# Altium footprint library Package_DFN_QFN.PcbLib: 557 footprints (part 18 of 35)
Each footprint in its own frame and in the unit in brackets; x right, y up, seen from the top. Pads: shape width x height; smd on the part's side, far side on the other; paste and mask are expansions set on the pad; w line width, h text height; cw(c..) or ccw(c..) is an arc to the next point about the centre after c.
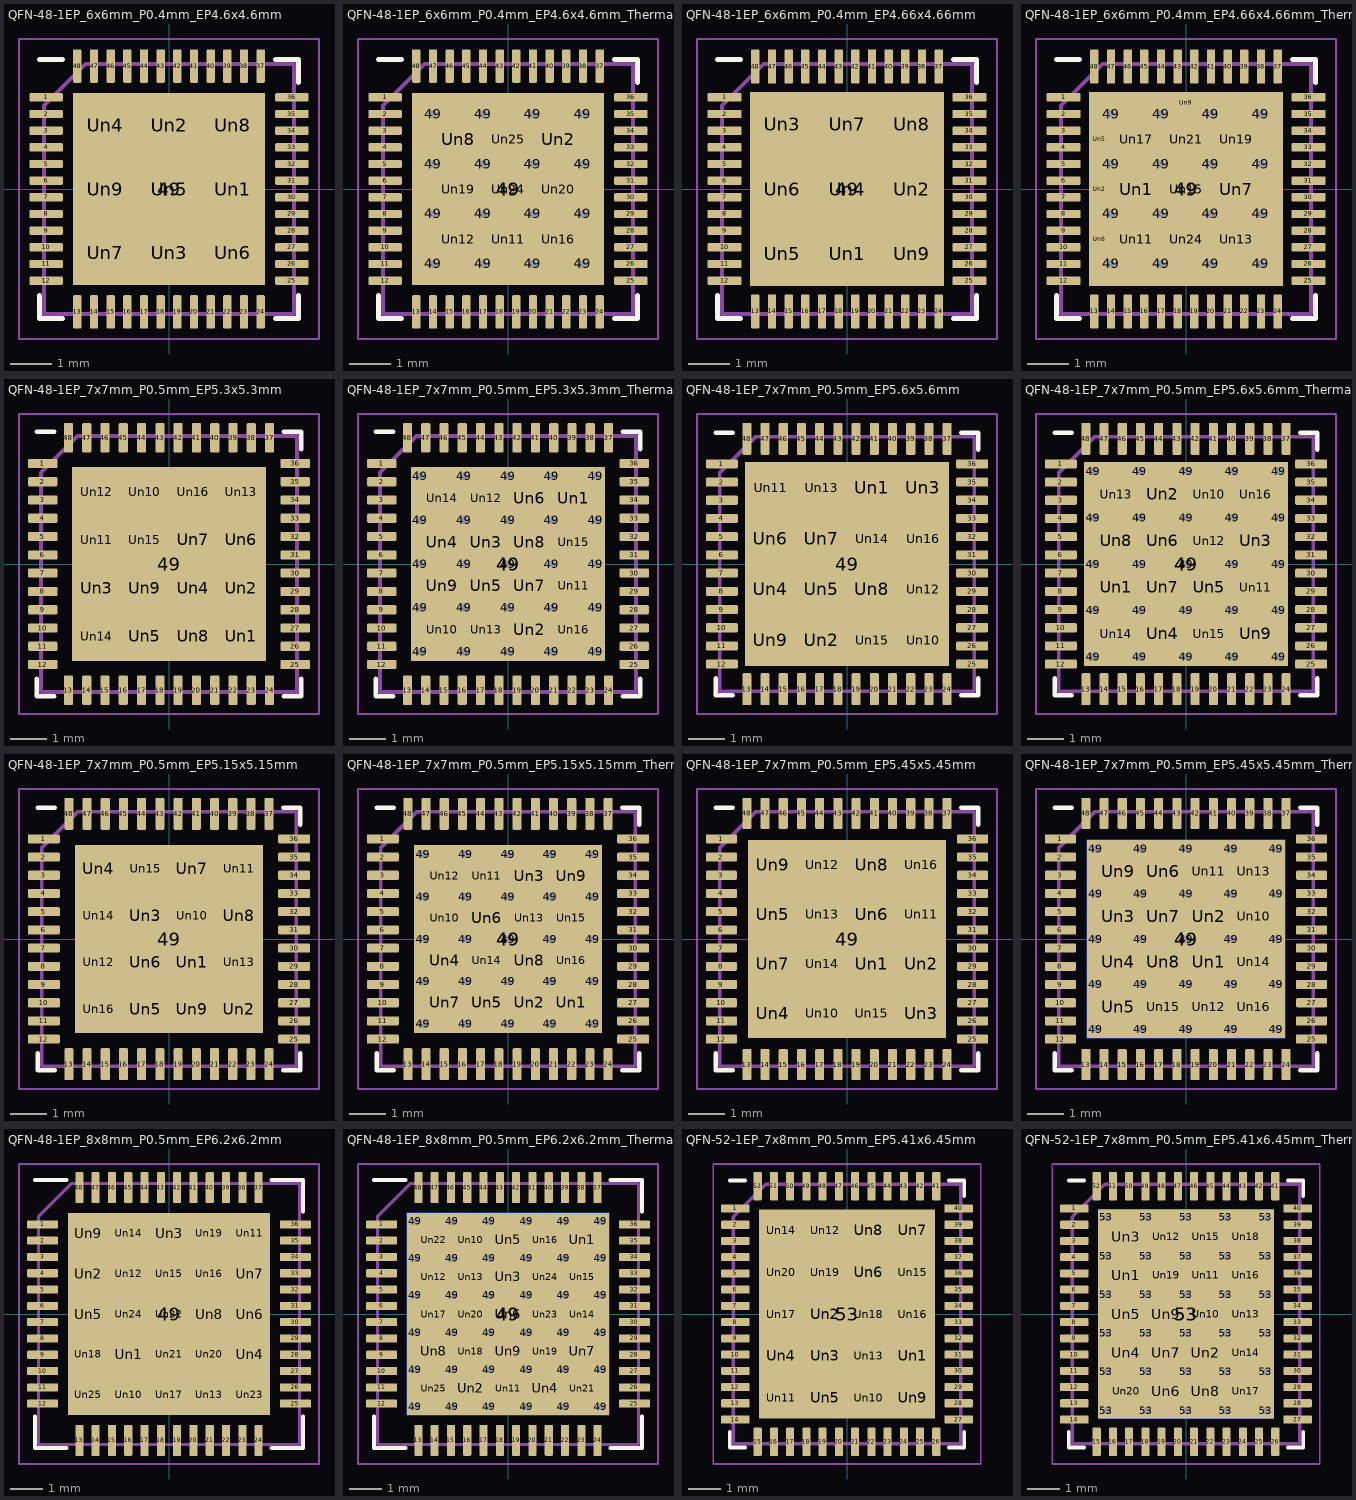
[diagram p17: the footprints below, top view; thin cyan lines are the x and y axes]

## QFN-48-1EP_6x6mm_P0.4mm_EP4.6x4.6mm [mm]
pads (58):
  rrect25% 0.8x0.2 smd: 1(-2.95,2.2) 2(-2.95,1.8) 3(-2.95,1.4) 4(-2.95,1) 5(-2.95,0.6) 6(-2.95,0.2) 7(-2.95,-0.2) 8(-2.95,-0.6) 9(-2.95,-1) 10(-2.95,-1.4) 11(-2.95,-1.8) 12(-2.95,-2.2) 25(2.95,-2.2) 26(2.95,-1.8) 27(2.95,-1.4) 28(2.95,-1) 29(2.95,-0.6) 30(2.95,-0.2) 31(2.95,0.2) 32(2.95,0.6) 33(2.95,1) 34(2.95,1.4) 35(2.95,1.8) 36(2.95,2.2)
  rrect25% 0.2x0.8 smd: 13(-2.2,-2.95) 14(-1.8,-2.95) 15(-1.4,-2.95) 16(-1,-2.95) 17(-0.6,-2.95) 18(-0.2,-2.95) 19(0.2,-2.95) 20(0.6,-2.95) 21(1,-2.95) 22(1.4,-2.95) 23(1.8,-2.95) 24(2.2,-2.95) 37(2.2,2.95) 38(1.8,2.95) 39(1.4,2.95) 40(1,2.95) 41(0.6,2.95) 42(0.2,2.95) 43(-0.2,2.95) 44(-0.6,2.95) 45(-1,2.95) 46(-1.4,2.95) 47(-1.8,2.95) 48(-2.2,2.95)
  rect 4.6x4.6 smd: 49(0,0)
  rrect20% 1.24x1.24 on Top Paste: Un1(1.53,0) Un2(0,1.53) Un3(0,-1.53) Un4(-1.53,1.53) Un5(0,0) Un6(1.53,-1.53) Un7(-1.53,-1.53) Un8(1.53,1.53) Un9(-1.53,0)
F.SilkS:
  lines w0.12: -3.11,-2.56 -3.11,-3.11 -2.56,-3.11 ; -3.11,3.11 -2.56,3.11 ; 2.56,-3.11 3.11,-3.11 3.11,-2.56 ; 2.56,3.11 3.11,3.11 3.11,2.56
F.CrtYd:
  lines w0.05: -3.6,-3.6 3.6,-3.6 3.6,3.6 -3.6,3.6 -3.6,-3.6
F.Fab:
  lines w0.1: -3,-3 3,-3 3,3 -2,3 -3,2 -3,-3
  text "'.Designator'" at -4.047,-0.84 h1

## QFN-48-1EP_6x6mm_P0.4mm_EP4.6x4.6mm_ThermalVias [mm]
pads (91):
  rrect25% 0.8x0.2 smd: 1(-2.95,2.2) 2(-2.95,1.8) 3(-2.95,1.4) 4(-2.95,1) 5(-2.95,0.6) 6(-2.95,0.2) 7(-2.95,-0.2) 8(-2.95,-0.6) 9(-2.95,-1) 10(-2.95,-1.4) 11(-2.95,-1.8) 12(-2.95,-2.2) 25(2.95,-2.2) 26(2.95,-1.8) 27(2.95,-1.4) 28(2.95,-1) 29(2.95,-0.6) 30(2.95,-0.2) 31(2.95,0.2) 32(2.95,0.6) 33(2.95,1) 34(2.95,1.4) 35(2.95,1.8) 36(2.95,2.2)
  rrect25% 0.2x0.8 smd: 13(-2.2,-2.95) 14(-1.8,-2.95) 15(-1.4,-2.95) 16(-1,-2.95) 17(-0.6,-2.95) 18(-0.2,-2.95) 19(0.2,-2.95) 20(0.6,-2.95) 21(1,-2.95) 22(1.4,-2.95) 23(1.8,-2.95) 24(2.2,-2.95) 37(2.2,2.95) 38(1.8,2.95) 39(1.4,2.95) 40(1,2.95) 41(0.6,2.95) 42(0.2,2.95) 43(-0.2,2.95) 44(-0.6,2.95) 45(-1,2.95) 46(-1.4,2.95) 47(-1.8,2.95) 48(-2.2,2.95)
  round 0.5 hole 0.2: 49(-1.8,-1.8) 49(-1.8,-0.6) 49(-1.8,0.6) 49(-1.8,1.8) 49(-0.6,-1.8) 49(-0.6,-0.6) 49(-0.6,0.6) 49(-0.6,1.8) 49(0.6,-1.8) 49(0.6,-0.6) 49(0.6,0.6) 49(0.6,1.8) 49(1.8,-1.8) 49(1.8,-0.6) 49(1.8,0.6) 49(1.8,1.8)
  rect 4.1x4.1 smd far side: 49(0,0)
  rect 4.6x4.6 smd: 49(0,0)
  round 0.32 on Top Paste: Un1(0,2.05) Un3(-1.2,-2.05) Un4(2.05,-1.2) Un5(2.05,1.2) Un7(1.2,-2.05) Un10(1.2,2.05) Un14(2.05,0) Un15(-2.05,0) Un17(0,-2.05) Un18(-2.05,1.2) Un21(-1.2,2.05) Un23(-2.05,-1.2)
  rrect25% 0.967x0.967 on Top Paste: Un2(1.2,1.2) Un8(-1.2,1.2) Un11(0,-1.2) Un12(-1.2,-1.2) Un16(1.2,-1.2) Un19(-1.2,0) Un20(1.2,0) Un24(0,0) Un25(0,1.2)
  round 0.272 on Top Paste: Un6(-2.05,2.05) Un9(2.05,-2.05) Un13(-2.05,-2.05) Un22(2.05,2.05)
F.SilkS:
  lines w0.12: -3.11,-2.56 -3.11,-3.11 -2.56,-3.11 ; -3.11,3.11 -2.56,3.11 ; 2.56,-3.11 3.11,-3.11 3.11,-2.56 ; 2.56,3.11 3.11,3.11 3.11,2.56
F.Paste:
  region: 0.4,2.001 0.331,1.932 -0.331,1.932 -0.4,2.001 -0.4,2.168 0.4,2.168
  region: -0.8,-2.001 -0.8,-2.168 -1.6,-2.168 -1.6,-2.001 -1.531,-1.932 -0.869,-1.932
  region: 2.168,-1.6 2.001,-1.6 1.932,-1.531 1.932,-0.869 2.001,-0.8 2.168,-0.8
  region: 2.168,0.8 2.001,0.8 1.932,0.869 1.932,1.531 2.001,1.6 2.168,1.6
  region: -1.949,2.076 -2.076,1.949 -2.151,1.949 -2.151,2.151 -1.949,2.151
  region: 1.6,-2.001 1.6,-2.168 0.8,-2.168 0.8,-2.001 0.869,-1.932 1.531,-1.932
  region: 2.151,-2.151 1.949,-2.151 1.949,-2.076 2.076,-1.949 2.151,-1.949
  region: 1.6,2.001 1.531,1.932 0.869,1.932 0.8,2.001 0.8,2.168 1.6,2.168
  region: -1.949,-2.076 -1.949,-2.151 -2.151,-2.151 -2.151,-1.949 -2.076,-1.949
  region: 2.168,-0.4 2.001,-0.4 1.932,-0.331 1.932,0.331 2.001,0.4 2.168,0.4
  region: -1.932,0.331 -1.932,-0.331 -2.001,-0.4 -2.168,-0.4 -2.168,0.4 -2.001,0.4
  region: 0.4,-2.001 0.4,-2.168 -0.4,-2.168 -0.4,-2.001 -0.331,-1.932 0.331,-1.932
  region: -1.932,1.531 -1.932,0.869 -2.001,0.8 -2.168,0.8 -2.168,1.6 -2.001,1.6
  region: -0.8,2.001 -0.869,1.932 -1.531,1.932 -1.6,2.001 -1.6,2.168 -0.8,2.168
  region: 2.151,1.949 2.076,1.949 1.949,2.076 1.949,2.151 2.151,2.151
  region: -1.932,-0.869 -1.932,-1.531 -2.001,-1.6 -2.168,-1.6 -2.168,-0.8 -2.001,-0.8
F.CrtYd:
  lines w0.05: -3.6,-3.6 -3.6,3.6 3.6,3.6 3.6,-3.6 -3.6,-3.6
F.Fab:
  lines w0.1: -3,-3 -3,2 -2,3 3,3 3,-3 -3,-3
  text "'.Designator'" at -4.047,-0.84 h1

## QFN-48-1EP_6x6mm_P0.4mm_EP4.66x4.66mm [mm]
pads (58):
  rrect25% 0.82x0.2 smd: 1(-2.94,2.2) 2(-2.94,1.8) 3(-2.94,1.4) 4(-2.94,1) 5(-2.94,0.6) 6(-2.94,0.2) 7(-2.94,-0.2) 8(-2.94,-0.6) 9(-2.94,-1) 10(-2.94,-1.4) 11(-2.94,-1.8) 12(-2.94,-2.2) 25(2.94,-2.2) 26(2.94,-1.8) 27(2.94,-1.4) 28(2.94,-1) 29(2.94,-0.6) 30(2.94,-0.2) 31(2.94,0.2) 32(2.94,0.6) 33(2.94,1) 34(2.94,1.4) 35(2.94,1.8) 36(2.94,2.2)
  rrect25% 0.2x0.82 smd: 13(-2.2,-2.94) 14(-1.8,-2.94) 15(-1.4,-2.94) 16(-1,-2.94) 17(-0.6,-2.94) 18(-0.2,-2.94) 19(0.2,-2.94) 20(0.6,-2.94) 21(1,-2.94) 22(1.4,-2.94) 23(1.8,-2.94) 24(2.2,-2.94) 37(2.2,2.94) 38(1.8,2.94) 39(1.4,2.94) 40(1,2.94) 41(0.6,2.94) 42(0.2,2.94) 43(-0.2,2.94) 44(-0.6,2.94) 45(-1,2.94) 46(-1.4,2.94) 47(-1.8,2.94) 48(-2.2,2.94)
  rect 4.66x4.66 smd: 49(0,0)
  rrect20% 1.25x1.25 on Top Paste: Un1(0,-1.55) Un2(1.55,0) Un3(-1.55,1.55) Un4(0,0) Un5(-1.55,-1.55) Un6(-1.55,0) Un7(0,1.55) Un8(1.55,1.55) Un9(1.55,-1.55)
F.SilkS:
  lines w0.12: -3.11,-2.56 -3.11,-3.11 -2.56,-3.11 ; -3.11,3.11 -2.56,3.11 ; 2.56,-3.11 3.11,-3.11 3.11,-2.56 ; 2.56,3.11 3.11,3.11 3.11,2.56
F.CrtYd:
  lines w0.05: -3.6,-3.6 -3.6,3.6 3.6,3.6 3.6,-3.6 -3.6,-3.6
F.Fab:
  lines w0.1: -3,-3 -3,2 -2,3 3,3 3,-3 -3,-3
  text "'.Designator'" at -4.047,-0.84 h1

## QFN-48-1EP_6x6mm_P0.4mm_EP4.66x4.66mm_ThermalVias [mm]
pads (91):
  rrect25% 0.82x0.2 smd: 1(-2.94,2.2) 2(-2.94,1.8) 3(-2.94,1.4) 4(-2.94,1) 5(-2.94,0.6) 6(-2.94,0.2) 7(-2.94,-0.2) 8(-2.94,-0.6) 9(-2.94,-1) 10(-2.94,-1.4) 11(-2.94,-1.8) 12(-2.94,-2.2) 25(2.94,-2.2) 26(2.94,-1.8) 27(2.94,-1.4) 28(2.94,-1) 29(2.94,-0.6) 30(2.94,-0.2) 31(2.94,0.2) 32(2.94,0.6) 33(2.94,1) 34(2.94,1.4) 35(2.94,1.8) 36(2.94,2.2)
  rrect25% 0.2x0.82 smd: 13(-2.2,-2.94) 14(-1.8,-2.94) 15(-1.4,-2.94) 16(-1,-2.94) 17(-0.6,-2.94) 18(-0.2,-2.94) 19(0.2,-2.94) 20(0.6,-2.94) 21(1,-2.94) 22(1.4,-2.94) 23(1.8,-2.94) 24(2.2,-2.94) 37(2.2,2.94) 38(1.8,2.94) 39(1.4,2.94) 40(1,2.94) 41(0.6,2.94) 42(0.2,2.94) 43(-0.2,2.94) 44(-0.6,2.94) 45(-1,2.94) 46(-1.4,2.94) 47(-1.8,2.94) 48(-2.2,2.94)
  round 0.5 hole 0.2: 49(-1.8,-1.8) 49(-1.8,-0.6) 49(-1.8,0.6) 49(-1.8,1.8) 49(-0.6,-1.8) 49(-0.6,-0.6) 49(-0.6,0.6) 49(-0.6,1.8) 49(0.6,-1.8) 49(0.6,-0.6) 49(0.6,0.6) 49(0.6,1.8) 49(1.8,-1.8) 49(1.8,-0.6) 49(1.8,0.6) 49(1.8,1.8)
  rect 4.1x4.1 smd far side: 49(0,0)
  rect 4.66x4.66 smd: 49(0,0)
  rrect25% 0.967x0.967 on Top Paste: Un1(-1.2,0) Un7(1.2,0) Un11(-1.2,-1.2) Un13(1.2,-1.2) Un15(0,0) Un17(-1.2,1.2) Un19(1.2,1.2) Un21(0,1.2) Un24(0,-1.2)
  round 0.346 on Top Paste: Un2(-2.065,0) Un5(-2.065,1.2) Un6(-2.065,-1.2) Un9(0,2.065) Un10(0,-2.065) Un12(-1.2,-2.065) Un16(1.2,2.065) Un18(2.065,0) Un20(2.065,1.2) Un22(2.065,-1.2) Un23(1.2,-2.065) Un25(-1.2,2.065)
  round 0.3 on Top Paste: Un3(2.065,-2.065) Un4(2.065,2.065) Un8(-2.065,-2.065) Un14(-2.065,2.065)
F.SilkS:
  lines w0.12: -3.11,-2.56 -3.11,-3.11 -2.56,-3.11 ; -3.11,3.11 -2.56,3.11 ; 2.56,-3.11 3.11,-3.11 3.11,-2.56 ; 2.56,3.11 3.11,3.11 3.11,2.56
F.Paste:
  region: -1.933,0.335 -1.933,-0.335 -2,-0.402 -2.197,-0.402 -2.197,0.402 -2,0.402
  region: 2.172,-2.172 1.958,-2.172 1.958,-2.076 2.076,-1.958 2.172,-1.958
  region: 2.172,1.958 2.076,1.958 1.958,2.076 1.958,2.172 2.172,2.172
  region: -1.933,1.535 -1.933,0.865 -2,0.798 -2.197,0.798 -2.197,1.602 -2,1.602
  region: -1.933,-0.865 -1.933,-1.535 -2,-1.602 -2.197,-1.602 -2.197,-0.798 -2,-0.798
  region: -1.958,-2.076 -1.958,-2.172 -2.172,-2.172 -2.172,-1.958 -2.076,-1.958
  region: 0.402,2 0.335,1.933 -0.335,1.933 -0.402,2 -0.402,2.197 0.402,2.197
  region: 0.402,-2 0.402,-2.197 -0.402,-2.197 -0.402,-2 -0.335,-1.933 0.335,-1.933
  region: -0.798,-2 -0.798,-2.197 -1.602,-2.197 -1.602,-2 -1.535,-1.933 -0.865,-1.933
  region: -1.958,2.076 -2.076,1.958 -2.172,1.958 -2.172,2.172 -1.958,2.172
  region: 1.602,2 1.535,1.933 0.865,1.933 0.798,2 0.798,2.197 1.602,2.197
  region: 2.197,-0.402 2,-0.402 1.933,-0.335 1.933,0.335 2,0.402 2.197,0.402
  region: 2.197,0.798 2,0.798 1.933,0.865 1.933,1.535 2,1.602 2.197,1.602
  region: 2.197,-1.602 2,-1.602 1.933,-1.535 1.933,-0.865 2,-0.798 2.197,-0.798
  region: 1.602,-2 1.602,-2.197 0.798,-2.197 0.798,-2 0.865,-1.933 1.535,-1.933
  region: -0.798,2 -0.865,1.933 -1.535,1.933 -1.602,2 -1.602,2.197 -0.798,2.197
F.CrtYd:
  lines w0.05: -3.6,-3.6 3.6,-3.6 3.6,3.6 -3.6,3.6 -3.6,-3.6
F.Fab:
  lines w0.1: -3,-3 -3,2 -2,3 3,3 3,-3 -3,-3
  text "'.Designator'" at -4.047,-0.84 h1

## QFN-48-1EP_7x7mm_P0.5mm_EP5.3x5.3mm [mm]
pads (65):
  rrect25% 0.8x0.25 smd: 1(-3.45,2.75) 2(-3.45,2.25) 3(-3.45,1.75) 4(-3.45,1.25) 5(-3.45,0.75) 6(-3.45,0.25) 7(-3.45,-0.25) 8(-3.45,-0.75) 9(-3.45,-1.25) 10(-3.45,-1.75) 11(-3.45,-2.25) 12(-3.45,-2.75) 25(3.45,-2.75) 26(3.45,-2.25) 27(3.45,-1.75) 28(3.45,-1.25) 29(3.45,-0.75) 30(3.45,-0.25) 31(3.45,0.25) 32(3.45,0.75) 33(3.45,1.25) 34(3.45,1.75) 35(3.45,2.25) 36(3.45,2.75)
  rrect25% 0.25x0.8 smd: 13(-2.75,-3.45) 14(-2.25,-3.45) 15(-1.75,-3.45) 16(-1.25,-3.45) 17(-0.75,-3.45) 18(-0.25,-3.45) 19(0.25,-3.45) 20(0.75,-3.45) 21(1.25,-3.45) 22(1.75,-3.45) 23(2.25,-3.45) 24(2.75,-3.45) 37(2.75,3.45) 38(2.25,3.45) 39(1.75,3.45) 40(1.25,3.45) 41(0.75,3.45) 42(0.25,3.45) 43(-0.25,3.45) 44(-0.75,3.45) 45(-1.25,3.45) 46(-1.75,3.45) 47(-2.25,3.45) 48(-2.75,3.45)
  rect 5.3x5.3 smd: 49(0,0)
  rrect23% 1.07x1.07 on Top Paste: Un1(1.98,-1.98) Un2(1.98,-0.66) Un3(-1.98,-0.66) Un4(0.66,-0.66) Un5(-0.66,-1.98) Un6(1.98,0.66) Un7(0.66,0.66) Un8(0.66,-1.98) Un9(-0.66,-0.66) Un10(-0.66,1.98) Un11(-1.98,0.66) Un12(-1.98,1.98) Un13(1.98,1.98) Un14(-1.98,-1.98) Un15(-0.66,0.66) Un16(0.66,1.98)
F.SilkS:
  lines w0.12: -3.61,-3.135 -3.61,-3.61 -3.135,-3.61 ; -3.61,3.61 -3.135,3.61 ; 3.135,-3.61 3.61,-3.61 3.61,-3.135 ; 3.135,3.61 3.61,3.61 3.61,3.135
F.CrtYd:
  lines w0.05: -4.1,-4.1 4.1,-4.1 4.1,4.1 -4.1,4.1 -4.1,-4.1
F.Fab:
  lines w0.1: -3.5,-3.5 3.5,-3.5 3.5,3.5 -2.5,3.5 -3.5,2.5 -3.5,-3.5
  text "'.Designator'" at -4.047,-0.84 h1

## QFN-48-1EP_7x7mm_P0.5mm_EP5.3x5.3mm_ThermalVias [mm]
pads (91):
  rrect25% 0.8x0.25 smd: 1(-3.45,2.75) 2(-3.45,2.25) 3(-3.45,1.75) 4(-3.45,1.25) 5(-3.45,0.75) 6(-3.45,0.25) 7(-3.45,-0.25) 8(-3.45,-0.75) 9(-3.45,-1.25) 10(-3.45,-1.75) 11(-3.45,-2.25) 12(-3.45,-2.75) 25(3.45,-2.75) 26(3.45,-2.25) 27(3.45,-1.75) 28(3.45,-1.25) 29(3.45,-0.75) 30(3.45,-0.25) 31(3.45,0.25) 32(3.45,0.75) 33(3.45,1.25) 34(3.45,1.75) 35(3.45,2.25) 36(3.45,2.75)
  rrect25% 0.25x0.8 smd: 13(-2.75,-3.45) 14(-2.25,-3.45) 15(-1.75,-3.45) 16(-1.25,-3.45) 17(-0.75,-3.45) 18(-0.25,-3.45) 19(0.25,-3.45) 20(0.75,-3.45) 21(1.25,-3.45) 22(1.75,-3.45) 23(2.25,-3.45) 24(2.75,-3.45) 37(2.75,3.45) 38(2.25,3.45) 39(1.75,3.45) 40(1.25,3.45) 41(0.75,3.45) 42(0.25,3.45) 43(-0.25,3.45) 44(-0.75,3.45) 45(-1.25,3.45) 46(-1.75,3.45) 47(-2.25,3.45) 48(-2.75,3.45)
  round 0.5 hole 0.2: 49(-2.4,-2.4) 49(-2.4,-1.2) 49(-2.4,0) 49(-2.4,1.2) 49(-2.4,2.4) 49(-1.2,-2.4) 49(-1.2,-1.2) 49(-1.2,0) 49(-1.2,1.2) 49(-1.2,2.4) 49(0,-2.4) 49(0,-1.2) 49(0,0) 49(0,1.2) 49(0,2.4) 49(1.2,-2.4) 49(1.2,-1.2) 49(1.2,0) 49(1.2,1.2) 49(1.2,2.4) 49(2.4,-2.4) 49(2.4,-1.2) 49(2.4,0) 49(2.4,1.2) 49(2.4,2.4)
  rect 5.3x5.3 smd: 49(0,0)
  rect 5.3x5.3 smd far side: 49(0,0)
  rrect24% 1.026x1.026 on Top Paste: Un1(1.8,1.8) Un2(0.6,-1.8) Un3(-0.6,0.6) Un4(-1.8,0.6) Un5(-0.6,-0.6) Un6(0.6,1.8) Un7(0.6,-0.6) Un8(0.6,0.6) Un9(-1.8,-0.6) Un10(-1.8,-1.8) Un11(1.8,-0.6) Un12(-0.6,1.8) Un13(-0.6,-1.8) Un14(-1.8,1.8) Un15(1.8,0.6) Un16(1.8,-1.8)
F.SilkS:
  lines w0.12: -3.61,-3.135 -3.61,-3.61 -3.135,-3.61 ; -3.61,3.61 -3.135,3.61 ; 3.135,-3.61 3.61,-3.61 3.61,-3.135 ; 3.135,3.61 3.61,3.61 3.61,3.135
F.CrtYd:
  lines w0.05: -4.1,-4.1 -4.1,4.1 4.1,4.1 4.1,-4.1 -4.1,-4.1
F.Fab:
  lines w0.1: -3.5,-3.5 3.5,-3.5 3.5,3.5 -2.5,3.5 -3.5,2.5 -3.5,-3.5
  text "'.Designator'" at -4.047,-0.84 h1

## QFN-48-1EP_7x7mm_P0.5mm_EP5.6x5.6mm [mm]
pads (65):
  rrect25% 0.875x0.25 smd: 1(-3.437,2.75) 2(-3.437,2.25) 3(-3.437,1.75) 4(-3.437,1.25) 5(-3.437,0.75) 6(-3.437,0.25) 7(-3.437,-0.25) 8(-3.437,-0.75) 9(-3.437,-1.25) 10(-3.437,-1.75) 11(-3.437,-2.25) 12(-3.437,-2.75) 25(3.437,-2.75) 26(3.437,-2.25) 27(3.437,-1.75) 28(3.437,-1.25) 29(3.437,-0.75) 30(3.437,-0.25) 31(3.437,0.25) 32(3.437,0.75) 33(3.437,1.25) 34(3.437,1.75) 35(3.437,2.25) 36(3.437,2.75)
  rrect25% 0.25x0.875 smd: 13(-2.75,-3.437) 14(-2.25,-3.437) 15(-1.75,-3.437) 16(-1.25,-3.437) 17(-0.75,-3.437) 18(-0.25,-3.437) 19(0.25,-3.437) 20(0.75,-3.437) 21(1.25,-3.437) 22(1.75,-3.437) 23(2.25,-3.437) 24(2.75,-3.437) 37(2.75,3.437) 38(2.25,3.437) 39(1.75,3.437) 40(1.25,3.437) 41(0.75,3.437) 42(0.25,3.437) 43(-0.25,3.437) 44(-0.75,3.437) 45(-1.25,3.437) 46(-1.75,3.437) 47(-2.25,3.437) 48(-2.75,3.437)
  rect 5.6x5.6 smd: 49(0,0)
  rrect22% 1.13x1.13 on Top Paste: Un1(0.7,2.1) Un2(-0.7,-2.1) Un3(2.1,2.1) Un4(-2.1,-0.7) Un5(-0.7,-0.7) Un6(-2.1,0.7) Un7(-0.7,0.7) Un8(0.7,-0.7) Un9(-2.1,-2.1) Un10(2.1,-2.1) Un11(-2.1,2.1) Un12(2.1,-0.7) Un13(-0.7,2.1) Un14(0.7,0.7) Un15(0.7,-2.1) Un16(2.1,0.7)
F.SilkS:
  lines w0.12: -3.61,-3.135 -3.61,-3.61 -3.135,-3.61 ; -3.61,3.61 -3.135,3.61 ; 3.135,-3.61 3.61,-3.61 3.61,-3.135 ; 3.135,3.61 3.61,3.61 3.61,3.135
F.CrtYd:
  lines w0.05: -4.12,-4.12 4.12,-4.12 4.12,4.12 -4.12,4.12 -4.12,-4.12
F.Fab:
  lines w0.1: -3.5,-3.5 -3.5,2.5 -2.5,3.5 3.5,3.5 3.5,-3.5 -3.5,-3.5
  text "'.Designator'" at -4.047,-0.84 h1

## QFN-48-1EP_7x7mm_P0.5mm_EP5.6x5.6mm_ThermalVias [mm]
pads (91):
  rrect25% 0.875x0.25 smd: 1(-3.437,2.75) 2(-3.437,2.25) 3(-3.437,1.75) 4(-3.437,1.25) 5(-3.437,0.75) 6(-3.437,0.25) 7(-3.437,-0.25) 8(-3.437,-0.75) 9(-3.437,-1.25) 10(-3.437,-1.75) 11(-3.437,-2.25) 12(-3.437,-2.75) 25(3.437,-2.75) 26(3.437,-2.25) 27(3.437,-1.75) 28(3.437,-1.25) 29(3.437,-0.75) 30(3.437,-0.25) 31(3.437,0.25) 32(3.437,0.75) 33(3.437,1.25) 34(3.437,1.75) 35(3.437,2.25) 36(3.437,2.75)
  rrect25% 0.25x0.875 smd: 13(-2.75,-3.437) 14(-2.25,-3.437) 15(-1.75,-3.437) 16(-1.25,-3.437) 17(-0.75,-3.437) 18(-0.25,-3.437) 19(0.25,-3.437) 20(0.75,-3.437) 21(1.25,-3.437) 22(1.75,-3.437) 23(2.25,-3.437) 24(2.75,-3.437) 37(2.75,3.437) 38(2.25,3.437) 39(1.75,3.437) 40(1.25,3.437) 41(0.75,3.437) 42(0.25,3.437) 43(-0.25,3.437) 44(-0.75,3.437) 45(-1.25,3.437) 46(-1.75,3.437) 47(-2.25,3.437) 48(-2.75,3.437)
  round 0.5 hole 0.2: 49(-2.55,-2.55) 49(-2.55,-1.275) 49(-2.55,0) 49(-2.55,1.275) 49(-2.55,2.55) 49(-1.275,-2.55) 49(-1.275,-1.275) 49(-1.275,0) 49(-1.275,1.275) 49(-1.275,2.55) 49(0,-2.55) 49(0,-1.275) 49(0,0) 49(0,1.275) 49(0,2.55) 49(1.275,-2.55) 49(1.275,-1.275) 49(1.275,0) 49(1.275,1.275) 49(1.275,2.55) 49(2.55,-2.55) 49(2.55,-1.275) 49(2.55,0) 49(2.55,1.275) 49(2.55,2.55)
  rect 5.6x5.6 smd far side: 49(0,0)
  rect 5.6x5.6 smd: 49(0,0)
  rrect23% 1.084x1.084 on Top Paste: Un1(-1.913,-0.637) Un2(-0.637,1.913) Un3(1.913,0.637) Un4(-0.637,-1.913) Un5(0.637,-0.637) Un6(-0.637,0.637) Un7(-0.637,-0.637) Un8(-1.913,0.637) Un9(1.913,-1.913) Un10(0.637,1.913) Un11(1.913,-0.637) Un12(0.637,0.637) Un13(-1.913,1.913) Un14(-1.913,-1.913) Un15(0.637,-1.913) Un16(1.913,1.913)
F.SilkS:
  lines w0.12: -3.61,-3.135 -3.61,-3.61 -3.135,-3.61 ; -3.61,3.61 -3.135,3.61 ; 3.135,-3.61 3.61,-3.61 3.61,-3.135 ; 3.135,3.61 3.61,3.61 3.61,3.135
F.CrtYd:
  lines w0.05: -4.12,-4.12 -4.12,4.12 4.12,4.12 4.12,-4.12 -4.12,-4.12
F.Fab:
  lines w0.1: -3.5,-3.5 -3.5,2.5 -2.5,3.5 3.5,3.5 3.5,-3.5 -3.5,-3.5
  text "'.Designator'" at -4.047,-0.84 h1

## QFN-48-1EP_7x7mm_P0.5mm_EP5.15x5.15mm [mm]
pads (65):
  rrect25% 0.875x0.25 smd: 1(-3.437,2.75) 2(-3.437,2.25) 3(-3.437,1.75) 4(-3.437,1.25) 5(-3.437,0.75) 6(-3.437,0.25) 7(-3.437,-0.25) 8(-3.437,-0.75) 9(-3.437,-1.25) 10(-3.437,-1.75) 11(-3.437,-2.25) 12(-3.437,-2.75) 25(3.437,-2.75) 26(3.437,-2.25) 27(3.437,-1.75) 28(3.437,-1.25) 29(3.437,-0.75) 30(3.437,-0.25) 31(3.437,0.25) 32(3.437,0.75) 33(3.437,1.25) 34(3.437,1.75) 35(3.437,2.25) 36(3.437,2.75)
  rrect25% 0.25x0.875 smd: 13(-2.75,-3.437) 14(-2.25,-3.437) 15(-1.75,-3.437) 16(-1.25,-3.437) 17(-0.75,-3.437) 18(-0.25,-3.437) 19(0.25,-3.437) 20(0.75,-3.437) 21(1.25,-3.437) 22(1.75,-3.437) 23(2.25,-3.437) 24(2.75,-3.437) 37(2.75,3.437) 38(2.25,3.437) 39(1.75,3.437) 40(1.25,3.437) 41(0.75,3.437) 42(0.25,3.437) 43(-0.25,3.437) 44(-0.75,3.437) 45(-1.25,3.437) 46(-1.75,3.437) 47(-2.25,3.437) 48(-2.75,3.437)
  rect 5.15x5.15 smd: 49(0,0)
  rrect24% 1.04x1.04 on Top Paste: Un1(0.645,-0.645) Un2(1.935,-1.935) Un3(-0.645,0.645) Un4(-1.935,1.935) Un5(-0.645,-1.935) Un6(-0.645,-0.645) Un7(0.645,1.935) Un8(1.935,0.645) Un9(0.645,-1.935) Un10(0.645,0.645) Un11(1.935,1.935) Un12(-1.935,-0.645) Un13(1.935,-0.645) Un14(-1.935,0.645) Un15(-0.645,1.935) Un16(-1.935,-1.935)
F.SilkS:
  lines w0.12: -3.61,-3.135 -3.61,-3.61 -3.135,-3.61 ; -3.61,3.61 -3.135,3.61 ; 3.135,-3.61 3.61,-3.61 3.61,-3.135 ; 3.135,3.61 3.61,3.61 3.61,3.135
F.CrtYd:
  lines w0.05: -4.12,-4.12 4.12,-4.12 4.12,4.12 -4.12,4.12 -4.12,-4.12
F.Fab:
  lines w0.1: -3.5,-3.5 3.5,-3.5 3.5,3.5 -2.5,3.5 -3.5,2.5 -3.5,-3.5
  text "'.Designator'" at -4.047,-0.84 h1

## QFN-48-1EP_7x7mm_P0.5mm_EP5.15x5.15mm_ThermalVias [mm]
pads (91):
  rrect25% 0.875x0.25 smd: 1(-3.437,2.75) 2(-3.437,2.25) 3(-3.437,1.75) 4(-3.437,1.25) 5(-3.437,0.75) 6(-3.437,0.25) 7(-3.437,-0.25) 8(-3.437,-0.75) 9(-3.437,-1.25) 10(-3.437,-1.75) 11(-3.437,-2.25) 12(-3.437,-2.75) 25(3.437,-2.75) 26(3.437,-2.25) 27(3.437,-1.75) 28(3.437,-1.25) 29(3.437,-0.75) 30(3.437,-0.25) 31(3.437,0.25) 32(3.437,0.75) 33(3.437,1.25) 34(3.437,1.75) 35(3.437,2.25) 36(3.437,2.75)
  rrect25% 0.25x0.875 smd: 13(-2.75,-3.437) 14(-2.25,-3.437) 15(-1.75,-3.437) 16(-1.25,-3.437) 17(-0.75,-3.437) 18(-0.25,-3.437) 19(0.25,-3.437) 20(0.75,-3.437) 21(1.25,-3.437) 22(1.75,-3.437) 23(2.25,-3.437) 24(2.75,-3.437) 37(2.75,3.437) 38(2.25,3.437) 39(1.75,3.437) 40(1.25,3.437) 41(0.75,3.437) 42(0.25,3.437) 43(-0.25,3.437) 44(-0.75,3.437) 45(-1.25,3.437) 46(-1.75,3.437) 47(-2.25,3.437) 48(-2.75,3.437)
  round 0.5 hole 0.2: 49(-2.325,-2.325) 49(-2.325,-1.162) 49(-2.325,0) 49(-2.325,1.162) 49(-2.325,2.325) 49(-1.162,-2.325) 49(-1.162,-1.162) 49(-1.162,0) 49(-1.162,1.162) 49(-1.162,2.325) 49(0,-2.325) 49(0,-1.162) 49(0,0) 49(0,1.162) 49(0,2.325) 49(1.162,-2.325) 49(1.162,-1.162) 49(1.162,0) 49(1.162,1.162) 49(1.162,2.325) 49(2.325,-2.325) 49(2.325,-1.162) 49(2.325,0) 49(2.325,1.162) 49(2.325,2.325)
  rect 5.15x5.15 smd far side: 49(0,0)
  rect 5.15x5.15 smd: 49(0,0)
  rrect25% 0.997x0.997 on Top Paste: Un1(1.744,-1.744) Un2(0.581,-1.744) Un3(0.581,1.744) Un4(-1.744,-0.581) Un5(-0.581,-1.744) Un6(-0.581,0.581) Un7(-1.744,-1.744) Un8(0.581,-0.581) Un9(1.744,1.744) Un10(-1.744,0.581) Un11(-0.581,1.744) Un12(-1.744,1.744) Un13(0.581,0.581) Un14(-0.581,-0.581) Un15(1.744,0.581) Un16(1.744,-0.581)
F.SilkS:
  lines w0.12: -3.61,-3.135 -3.61,-3.61 -3.135,-3.61 ; -3.61,3.61 -3.135,3.61 ; 3.135,-3.61 3.61,-3.61 3.61,-3.135 ; 3.135,3.61 3.61,3.61 3.61,3.135
F.CrtYd:
  lines w0.05: -4.12,-4.12 -4.12,4.12 4.12,4.12 4.12,-4.12 -4.12,-4.12
F.Fab:
  lines w0.1: -3.5,-3.5 3.5,-3.5 3.5,3.5 -2.5,3.5 -3.5,2.5 -3.5,-3.5
  text "'.Designator'" at -4.047,-0.84 h1

## QFN-48-1EP_7x7mm_P0.5mm_EP5.45x5.45mm [mm]
pads (65):
  rrect25% 0.85x0.25 smd: 1(-3.45,2.75) 2(-3.45,2.25) 3(-3.45,1.75) 4(-3.45,1.25) 5(-3.45,0.75) 6(-3.45,0.25) 7(-3.45,-0.25) 8(-3.45,-0.75) 9(-3.45,-1.25) 10(-3.45,-1.75) 11(-3.45,-2.25) 12(-3.45,-2.75) 25(3.45,-2.75) 26(3.45,-2.25) 27(3.45,-1.75) 28(3.45,-1.25) 29(3.45,-0.75) 30(3.45,-0.25) 31(3.45,0.25) 32(3.45,0.75) 33(3.45,1.25) 34(3.45,1.75) 35(3.45,2.25) 36(3.45,2.75)
  rrect25% 0.25x0.85 smd: 13(-2.75,-3.45) 14(-2.25,-3.45) 15(-1.75,-3.45) 16(-1.25,-3.45) 17(-0.75,-3.45) 18(-0.25,-3.45) 19(0.25,-3.45) 20(0.75,-3.45) 21(1.25,-3.45) 22(1.75,-3.45) 23(2.25,-3.45) 24(2.75,-3.45) 37(2.75,3.45) 38(2.25,3.45) 39(1.75,3.45) 40(1.25,3.45) 41(0.75,3.45) 42(0.25,3.45) 43(-0.25,3.45) 44(-0.75,3.45) 45(-1.25,3.45) 46(-1.75,3.45) 47(-2.25,3.45) 48(-2.75,3.45)
  rect 5.45x5.45 smd: 49(0,0)
  rrect23% 1.1x1.1 on Top Paste: Un1(0.68,-0.68) Un2(2.04,-0.68) Un3(2.04,-2.04) Un4(-2.04,-2.04) Un5(-2.04,0.68) Un6(0.68,0.68) Un7(-2.04,-0.68) Un8(0.68,2.04) Un9(-2.04,2.04) Un10(-0.68,-2.04) Un11(2.04,0.68) Un12(-0.68,2.04) Un13(-0.68,0.68) Un14(-0.68,-0.68) Un15(0.68,-2.04) Un16(2.04,2.04)
F.SilkS:
  lines w0.12: -3.61,-3.135 -3.61,-3.61 -3.135,-3.61 ; -3.61,3.61 -3.135,3.61 ; 3.135,-3.61 3.61,-3.61 3.61,-3.135 ; 3.135,3.61 3.61,3.61 3.61,3.135
F.CrtYd:
  lines w0.05: -4.12,-4.12 -4.12,4.12 4.12,4.12 4.12,-4.12 -4.12,-4.12
F.Fab:
  lines w0.1: -3.5,-3.5 3.5,-3.5 3.5,3.5 -2.5,3.5 -3.5,2.5 -3.5,-3.5
  text "'.Designator'" at -4.047,-0.84 h1

## QFN-48-1EP_7x7mm_P0.5mm_EP5.45x5.45mm_ThermalVias [mm]
pads (91):
  rrect25% 0.85x0.25 smd: 1(-3.45,2.75) 2(-3.45,2.25) 3(-3.45,1.75) 4(-3.45,1.25) 5(-3.45,0.75) 6(-3.45,0.25) 7(-3.45,-0.25) 8(-3.45,-0.75) 9(-3.45,-1.25) 10(-3.45,-1.75) 11(-3.45,-2.25) 12(-3.45,-2.75) 25(3.45,-2.75) 26(3.45,-2.25) 27(3.45,-1.75) 28(3.45,-1.25) 29(3.45,-0.75) 30(3.45,-0.25) 31(3.45,0.25) 32(3.45,0.75) 33(3.45,1.25) 34(3.45,1.75) 35(3.45,2.25) 36(3.45,2.75)
  rrect25% 0.25x0.85 smd: 13(-2.75,-3.45) 14(-2.25,-3.45) 15(-1.75,-3.45) 16(-1.25,-3.45) 17(-0.75,-3.45) 18(-0.25,-3.45) 19(0.25,-3.45) 20(0.75,-3.45) 21(1.25,-3.45) 22(1.75,-3.45) 23(2.25,-3.45) 24(2.75,-3.45) 37(2.75,3.45) 38(2.25,3.45) 39(1.75,3.45) 40(1.25,3.45) 41(0.75,3.45) 42(0.25,3.45) 43(-0.25,3.45) 44(-0.75,3.45) 45(-1.25,3.45) 46(-1.75,3.45) 47(-2.25,3.45) 48(-2.75,3.45)
  round 0.5 hole 0.2: 49(-2.475,-2.475) 49(-2.475,-1.238) 49(-2.475,0) 49(-2.475,1.238) 49(-2.475,2.475) 49(-1.238,-2.475) 49(-1.238,-1.238) 49(-1.238,0) 49(-1.238,1.238) 49(-1.238,2.475) 49(0,-2.475) 49(0,-1.238) 49(0,0) 49(0,1.238) 49(0,2.475) 49(1.238,-2.475) 49(1.238,-1.238) 49(1.238,0) 49(1.238,1.238) 49(1.238,2.475) 49(2.475,-2.475) 49(2.475,-1.238) 49(2.475,0) 49(2.475,1.238) 49(2.475,2.475)
  rect 5.45x5.45 smd far side: 49(0,0)
  rect 5.45x5.45 smd: 49(0,0)
  rrect23% 1.098x1.098 on Top Paste: Un1(0.619,-0.619) Un2(0.619,0.619) Un3(-1.856,0.619) Un4(-1.856,-0.619) Un5(-1.856,-1.856) Un6(-0.619,1.856) Un7(-0.619,0.619) Un8(-0.619,-0.619) Un9(-1.856,1.856) Un10(1.856,0.619) Un11(0.619,1.856) Un12(0.619,-1.856) Un13(1.856,1.856) Un14(1.856,-0.619) Un15(-0.619,-1.856) Un16(1.856,-1.856)
F.SilkS:
  lines w0.12: -3.61,-3.135 -3.61,-3.61 -3.135,-3.61 ; -3.61,3.61 -3.135,3.61 ; 3.135,-3.61 3.61,-3.61 3.61,-3.135 ; 3.135,3.61 3.61,3.61 3.61,3.135
F.CrtYd:
  lines w0.05: -4.12,-4.12 4.12,-4.12 4.12,4.12 -4.12,4.12 -4.12,-4.12
F.Fab:
  lines w0.1: -3.5,-3.5 3.5,-3.5 3.5,3.5 -2.5,3.5 -3.5,2.5 -3.5,-3.5
  text "'.Designator'" at -4.047,-0.84 h1

## QFN-48-1EP_8x8mm_P0.5mm_EP6.2x6.2mm [mm]
pads (74):
  rrect25% 0.95x0.25 smd: 1(-3.875,2.75) 2(-3.875,2.25) 3(-3.875,1.75) 4(-3.875,1.25) 5(-3.875,0.75) 6(-3.875,0.25) 7(-3.875,-0.25) 8(-3.875,-0.75) 9(-3.875,-1.25) 10(-3.875,-1.75) 11(-3.875,-2.25) 12(-3.875,-2.75) 25(3.875,-2.75) 26(3.875,-2.25) 27(3.875,-1.75) 28(3.875,-1.25) 29(3.875,-0.75) 30(3.875,-0.25) 31(3.875,0.25) 32(3.875,0.75) 33(3.875,1.25) 34(3.875,1.75) 35(3.875,2.25) 36(3.875,2.75)
  rrect25% 0.25x0.95 smd: 13(-2.75,-3.875) 14(-2.25,-3.875) 15(-1.75,-3.875) 16(-1.25,-3.875) 17(-0.75,-3.875) 18(-0.25,-3.875) 19(0.25,-3.875) 20(0.75,-3.875) 21(1.25,-3.875) 22(1.75,-3.875) 23(2.25,-3.875) 24(2.75,-3.875) 37(2.75,3.875) 38(2.25,3.875) 39(1.75,3.875) 40(1.25,3.875) 41(0.75,3.875) 42(0.25,3.875) 43(-0.25,3.875) 44(-0.75,3.875) 45(-1.25,3.875) 46(-1.75,3.875) 47(-2.25,3.875) 48(-2.75,3.875)
  rect 6.2x6.2 smd: 49(0,0)
  rrect25% 1x1 on Top Paste: Un1(-1.24,-1.24) Un2(-2.48,1.24) Un3(0,2.48) Un4(2.48,-1.24) Un5(-2.48,0) Un6(2.48,0) Un7(2.48,1.24) Un8(1.24,0) Un9(-2.48,2.48) Un10(-1.24,-2.48) Un11(2.48,2.48) Un12(-1.24,1.24) Un13(1.24,-2.48) Un14(-1.24,2.48) Un15(0,1.24) Un16(1.24,1.24) Un17(0,-2.48) Un18(-2.48,-1.24) Un19(1.24,2.48) Un20(1.24,-1.24) Un21(0,-1.24) Un22(0,0) Un23(2.48,-2.48) Un24(-1.24,0) Un25(-2.48,-2.48)
F.SilkS:
  lines w0.12: -4.11,-3.135 -4.11,-4.11 -3.135,-4.11 ; -4.11,4.11 -3.135,4.11 ; 3.135,-4.11 4.11,-4.11 4.11,-3.135 ; 3.135,4.11 4.11,4.11 4.11,3.135
F.CrtYd:
  lines w0.05: -4.6,-4.6 4.6,-4.6 4.6,4.6 -4.6,4.6 -4.6,-4.6
F.Fab:
  lines w0.1: -4,-4 -4,3 -3,4 4,4 4,-4 -4,-4
  text "'.Designator'" at -4.047,-0.84 h1

## QFN-48-1EP_8x8mm_P0.5mm_EP6.2x6.2mm_ThermalVias [mm]
pads (111):
  rrect25% 0.95x0.25 smd: 1(-3.875,2.75) 2(-3.875,2.25) 3(-3.875,1.75) 4(-3.875,1.25) 5(-3.875,0.75) 6(-3.875,0.25) 7(-3.875,-0.25) 8(-3.875,-0.75) 9(-3.875,-1.25) 10(-3.875,-1.75) 11(-3.875,-2.25) 12(-3.875,-2.75) 25(3.875,-2.75) 26(3.875,-2.25) 27(3.875,-1.75) 28(3.875,-1.25) 29(3.875,-0.75) 30(3.875,-0.25) 31(3.875,0.25) 32(3.875,0.75) 33(3.875,1.25) 34(3.875,1.75) 35(3.875,2.25) 36(3.875,2.75)
  rrect25% 0.25x0.95 smd: 13(-2.75,-3.875) 14(-2.25,-3.875) 15(-1.75,-3.875) 16(-1.25,-3.875) 17(-0.75,-3.875) 18(-0.25,-3.875) 19(0.25,-3.875) 20(0.75,-3.875) 21(1.25,-3.875) 22(1.75,-3.875) 23(2.25,-3.875) 24(2.75,-3.875) 37(2.75,3.875) 38(2.25,3.875) 39(1.75,3.875) 40(1.25,3.875) 41(0.75,3.875) 42(0.25,3.875) 43(-0.25,3.875) 44(-0.75,3.875) 45(-1.25,3.875) 46(-1.75,3.875) 47(-2.25,3.875) 48(-2.75,3.875)
  round 0.5 hole 0.2: 49(-2.85,-2.85) 49(-2.85,-1.71) 49(-2.85,-0.57) 49(-2.85,0.57) 49(-2.85,1.71) 49(-2.85,2.85) 49(-1.71,-2.85) 49(-1.71,-1.71) 49(-1.71,-0.57) 49(-1.71,0.57) 49(-1.71,1.71) 49(-1.71,2.85) 49(-0.57,-2.85) 49(-0.57,-1.71) 49(-0.57,-0.57) 49(-0.57,0.57) 49(-0.57,1.71) 49(-0.57,2.85) 49(0.57,-2.85) 49(0.57,-1.71) 49(0.57,-0.57) 49(0.57,0.57) 49(0.57,1.71) 49(0.57,2.85) 49(1.71,-2.85) 49(1.71,-1.71) 49(1.71,-0.57) 49(1.71,0.57) 49(1.71,1.71) 49(1.71,2.85) 49(2.85,-2.85) 49(2.85,-1.71) 49(2.85,-0.57) 49(2.85,0.57) 49(2.85,1.71) 49(2.85,2.85)
  rect 6.2x6.2 smd far side: 49(0,0)
  rect 6.2x6.2 smd: 49(0,0)
  rrect25% 0.961x0.961 on Top Paste: Un1(2.28,2.28) Un2(-1.14,-2.28) Un3(0,1.14) Un4(1.14,-2.28) Un5(0,2.28) Un6(0,0) Un7(2.28,-1.14) Un8(-2.28,-1.14) Un9(0,-1.14) Un10(-1.14,2.28) Un11(0,-2.28) Un12(-2.28,1.14) Un13(-1.14,1.14) Un14(2.28,0) Un15(2.28,1.14) Un16(1.14,2.28) Un17(-2.28,0) Un18(-1.14,-1.14) Un19(1.14,-1.14) Un20(-1.14,0) Un21(2.28,-2.28) Un22(-2.28,2.28) Un23(1.14,0) Un24(1.14,1.14) Un25(-2.28,-2.28)
F.SilkS:
  lines w0.12: -4.11,-3.135 -4.11,-4.11 -3.135,-4.11 ; -4.11,4.11 -3.135,4.11 ; 3.135,-4.11 4.11,-4.11 4.11,-3.135 ; 3.135,4.11 4.11,4.11 4.11,3.135
F.CrtYd:
  lines w0.05: -4.6,-4.6 4.6,-4.6 4.6,4.6 -4.6,4.6 -4.6,-4.6
F.Fab:
  lines w0.1: -4,-4 4,-4 4,4 -3,4 -4,3 -4,-4
  text "'.Designator'" at -4.047,-0.84 h1

## QFN-52-1EP_7x8mm_P0.5mm_EP5.41x6.45mm [mm]
pads (73):
  rrect25% 0.875x0.25 smd: 1(-3.437,3.25) 2(-3.437,2.75) 3(-3.437,2.25) 4(-3.437,1.75) 5(-3.437,1.25) 6(-3.437,0.75) 7(-3.437,0.25) 8(-3.437,-0.25) 9(-3.437,-0.75) 10(-3.437,-1.25) 11(-3.437,-1.75) 12(-3.437,-2.25) 13(-3.437,-2.75) 14(-3.437,-3.25) 27(3.437,-3.25) 28(3.437,-2.75) 29(3.437,-2.25) 30(3.437,-1.75) 31(3.437,-1.25) 32(3.437,-0.75) 33(3.437,-0.25) 34(3.437,0.25) 35(3.437,0.75) 36(3.437,1.25) 37(3.437,1.75) 38(3.437,2.25) 39(3.437,2.75) 40(3.437,3.25)
  rrect25% 0.25x0.875 smd: 15(-2.75,-3.938) 16(-2.25,-3.938) 17(-1.75,-3.938) 18(-1.25,-3.938) 19(-0.75,-3.938) 20(-0.25,-3.938) 21(0.25,-3.938) 22(0.75,-3.938) 23(1.25,-3.938) 24(1.75,-3.938) 25(2.25,-3.938) 26(2.75,-3.938) 41(2.75,3.938) 42(2.25,3.938) 43(1.75,3.938) 44(1.25,3.938) 45(0.75,3.938) 46(0.25,3.938) 47(-0.25,3.938) 48(-0.75,3.938) 49(-1.25,3.938) 50(-1.75,3.938) 51(-2.25,3.938) 52(-2.75,3.938)
  rect 5.41x6.45 smd: 53(0,0)
  rrect24% 1.09x1.04 on Top Paste: Un1(2.025,-1.29) Un2(-0.675,0) Un3(-0.675,-1.29) Un4(-2.025,-1.29) Un5(-0.675,-2.58) Un6(0.675,1.29) Un7(2.025,2.58) Un8(0.675,2.58) Un9(2.025,-2.58) Un10(0.675,-2.58) Un11(-2.025,-2.58) Un12(-0.675,2.58) Un13(0.675,-1.29) Un14(-2.025,2.58) Un15(2.025,1.29) Un16(2.025,0) Un17(-2.025,0) Un18(0.675,0) Un19(-0.675,1.29) Un20(-2.025,1.29)
F.SilkS:
  lines w0.12: -3.61,-3.635 -3.61,-4.11 -3.135,-4.11 ; -3.61,4.11 -3.135,4.11 ; 3.135,-4.11 3.61,-4.11 3.61,-3.635 ; 3.135,4.11 3.61,4.11 3.61,3.635
F.CrtYd:
  lines w0.05: -4.12,-4.62 -4.12,4.62 4.12,4.62 4.12,-4.62 -4.12,-4.62
F.Fab:
  lines w0.1: -3.5,-4 3.5,-4 3.5,4 -2.5,4 -3.5,3 -3.5,-4
  text "'.Designator'" at -4.047,-0.84 h1

## QFN-52-1EP_7x8mm_P0.5mm_EP5.41x6.45mm_ThermalVias [mm]
pads (104):
  rrect25% 0.875x0.25 smd: 1(-3.437,3.25) 2(-3.437,2.75) 3(-3.437,2.25) 4(-3.437,1.75) 5(-3.437,1.25) 6(-3.437,0.75) 7(-3.437,0.25) 8(-3.437,-0.25) 9(-3.437,-0.75) 10(-3.437,-1.25) 11(-3.437,-1.75) 12(-3.437,-2.25) 13(-3.437,-2.75) 14(-3.437,-3.25) 27(3.437,-3.25) 28(3.437,-2.75) 29(3.437,-2.25) 30(3.437,-1.75) 31(3.437,-1.25) 32(3.437,-0.75) 33(3.437,-0.25) 34(3.437,0.25) 35(3.437,0.75) 36(3.437,1.25) 37(3.437,1.75) 38(3.437,2.25) 39(3.437,2.75) 40(3.437,3.25)
  rrect25% 0.25x0.875 smd: 15(-2.75,-3.938) 16(-2.25,-3.938) 17(-1.75,-3.938) 18(-1.25,-3.938) 19(-0.75,-3.938) 20(-0.25,-3.938) 21(0.25,-3.938) 22(0.75,-3.938) 23(1.25,-3.938) 24(1.75,-3.938) 25(2.25,-3.938) 26(2.75,-3.938) 41(2.75,3.938) 42(2.25,3.938) 43(1.75,3.938) 44(1.25,3.938) 45(0.75,3.938) 46(0.25,3.938) 47(-0.25,3.938) 48(-0.75,3.938) 49(-1.25,3.938) 50(-1.75,3.938) 51(-2.25,3.938) 52(-2.75,3.938)
  round 0.5 hole 0.2: 53(-2.455,-2.975) 53(-2.455,-1.785) 53(-2.455,-0.595) 53(-2.455,0.595) 53(-2.455,1.785) 53(-2.455,2.975) 53(-1.228,-2.975) 53(-1.228,-1.785) 53(-1.228,-0.595) 53(-1.228,0.595) 53(-1.228,1.785) 53(-1.228,2.975) 53(0,-2.975) 53(0,-1.785) 53(0,-0.595) 53(0,0.595) 53(0,1.785) 53(0,2.975) 53(1.228,-2.975) 53(1.228,-1.785) 53(1.228,-0.595) 53(1.228,0.595) 53(1.228,1.785) 53(1.228,2.975) 53(2.455,-2.975) 53(2.455,-1.785) 53(2.455,-0.595) 53(2.455,0.595) 53(2.455,1.785) 53(2.455,2.975)
  rect 5.41x6.45 smd: 53(0,0)
  rect 5.41x6.45 smd far side: 53(0,0)
  rrect25% 1.048x0.999 on Top Paste: Un1(-1.841,1.19) Un2(0.614,-1.19) Un3(-1.841,2.38) Un4(-1.841,-1.19) Un5(-1.841,0) Un6(-0.614,-2.38) Un7(-0.614,-1.19) Un8(0.614,-2.38) Un9(-0.614,0) Un10(0.614,0) Un11(0.614,1.19) Un12(-0.614,2.38) Un13(1.841,0) Un14(1.841,-1.19) Un15(0.614,2.38) Un16(1.841,1.19) Un17(1.841,-2.38) Un18(1.841,2.38) Un19(-0.614,1.19) Un20(-1.841,-2.38)
F.SilkS:
  lines w0.12: -3.61,-3.635 -3.61,-4.11 -3.135,-4.11 ; -3.61,4.11 -3.135,4.11 ; 3.135,-4.11 3.61,-4.11 3.61,-3.635 ; 3.135,4.11 3.61,4.11 3.61,3.635
F.CrtYd:
  lines w0.05: -4.12,-4.62 4.12,-4.62 4.12,4.62 -4.12,4.62 -4.12,-4.62
F.Fab:
  lines w0.1: -3.5,-4 3.5,-4 3.5,4 -2.5,4 -3.5,3 -3.5,-4
  text "'.Designator'" at -4.047,-0.84 h1